# Altium footprint library Sockets.PcbLib: 80 footprints (part 3 of 6)
Each footprint in its own frame and in the unit in brackets; x right, y up, seen from the top. Pads: shape width x height; smd on the part's side, far side on the other; paste and mask are expansions set on the pad; w line width, h text height; cw(c..) or ccw(c..) is an arc to the next point about the centre after c.
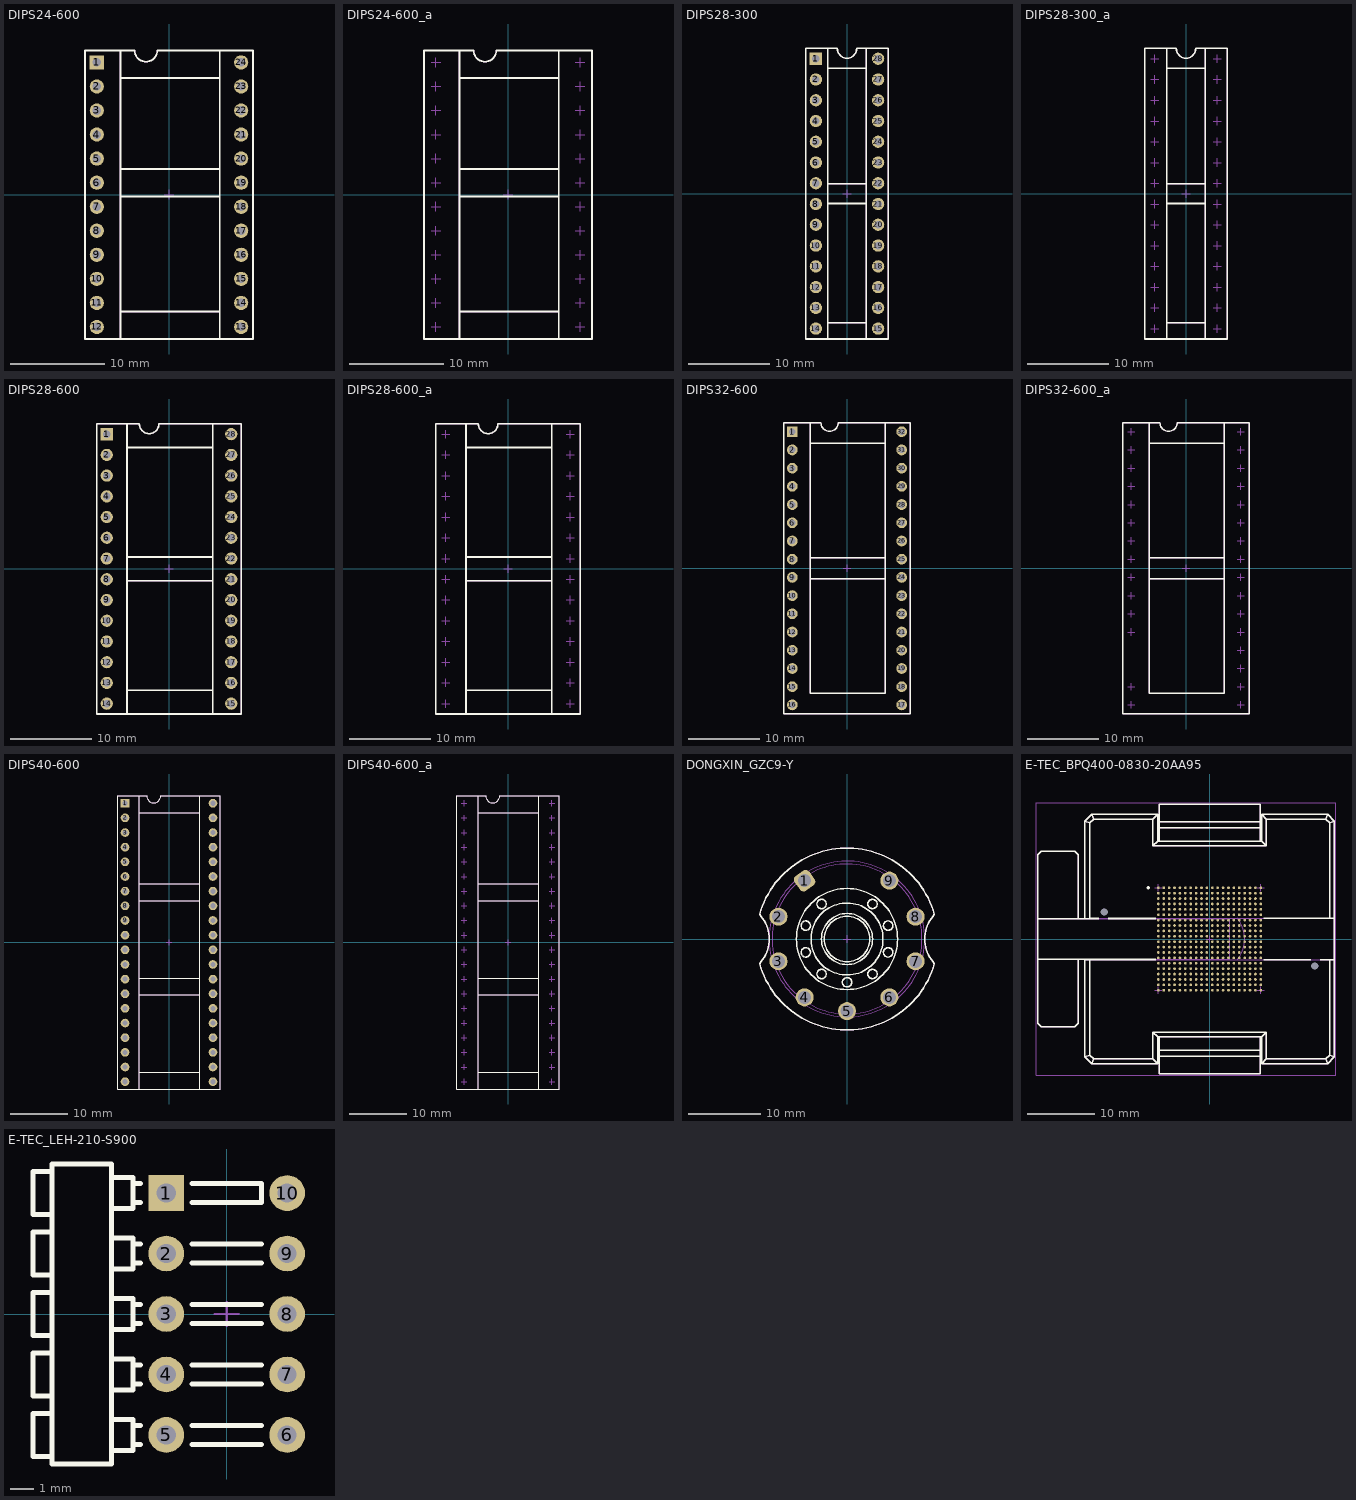
[diagram p2: the footprints below, top view; thin cyan lines are the x and y axes]

## DIPS24-600 [mm] "DIP Socket 24 Leads, Row Spacing 15.24mm; Pitch 2.54mm"
height 4.2
pads (24):
  rect 1.5x1.5 hole 0.9: 1(-7.62,13.97)
  round 1.5 hole 0.9: 2(-7.62,11.43) 3(-7.62,8.89) 4(-7.62,6.35) 5(-7.62,3.81) 6(-7.62,1.27) 7(-7.62,-1.27) 8(-7.62,-3.81) 9(-7.62,-6.35) 10(-7.62,-8.89) 11(-7.62,-11.43) 12(-7.62,-13.97) 13(7.62,-13.97) 14(7.62,-11.43) 15(7.62,-8.89) 16(7.62,-6.35) 17(7.62,-3.81) 18(7.62,-1.27) 19(7.62,1.27) 20(7.62,3.81) 21(7.62,6.35) 22(7.62,8.89) 23(7.62,11.43) 24(7.62,13.97)
Top Overlay:
  lines w0.2: -5.14,-15.24 -5.14,15.24 ; -5.14,-12.34 5.36,-12.34 ; -5.14,-0.18 5.36,-0.18 ; -5.14,2.72 5.36,2.72 ; -5.14,12.34 5.36,12.34 ; 5.36,-15.24 5.36,15.24 ; -8.85,-15.24 -8.85,15.24 -3.63,15.24 ccw(c-2.43,15.24) -1.23,15.24 8.85,15.24 8.85,-15.24 -8.85,-15.24
Mechanical 8:
  lines w0.1: -8.12,-13.97 -7.62,-13.97 ; -8.12,-11.43 -7.62,-11.43 ; -8.12,-8.89 -7.62,-8.89 ; -8.12,-6.35 -7.62,-6.35 ; -8.12,-3.81 -7.62,-3.81 ; -8.12,-1.27 -7.62,-1.27 ; -8.12,1.27 -7.62,1.27 ; -8.12,3.81 -7.62,3.81 ; -8.12,6.35 -7.62,6.35 ; -8.12,8.89 -7.62,8.89 ; -8.12,11.43 -7.62,11.43 ; -8.12,13.97 -7.62,13.97 ; -7.62,-14.47 -7.62,-13.97 ; -7.62,-13.47 -7.62,-13.97 ; -7.62,-11.93 -7.62,-11.43 ; -7.62,-10.93 -7.62,-11.43 ; -7.62,-9.39 -7.62,-8.89 ; -7.62,-8.39 -7.62,-8.89 ; -7.62,-6.85 -7.62,-6.35 ; -7.62,-5.85 -7.62,-6.35 ; -7.62,-4.31 -7.62,-3.81 ; -7.62,-3.31 -7.62,-3.81 ; -7.62,-1.77 -7.62,-1.27 ; -7.62,-0.77 -7.62,-1.27 ; -7.62,0.77 -7.62,1.27 ; -7.62,1.77 -7.62,1.27 ; -7.62,3.31 -7.62,3.81 ; -7.62,4.31 -7.62,3.81 ; -7.62,5.85 -7.62,6.35 ; -7.62,6.85 -7.62,6.35 ; -7.62,8.39 -7.62,8.89 ; -7.62,9.39 -7.62,8.89 ; -7.62,10.93 -7.62,11.43 ; -7.62,11.93 -7.62,11.43 ; -7.62,13.47 -7.62,13.97 ; -7.62,14.47 -7.62,13.97 ; -7.12,-13.97 -7.62,-13.97 ; -7.12,-11.43 -7.62,-11.43 ; -7.12,-8.89 -7.62,-8.89 ; -7.12,-6.35 -7.62,-6.35 ; -7.12,-3.81 -7.62,-3.81 ; -7.12,-1.27 -7.62,-1.27 ; -7.12,1.27 -7.62,1.27 ; -7.12,3.81 -7.62,3.81 ; -7.12,6.35 -7.62,6.35 ; -7.12,8.89 -7.62,8.89 ; -7.12,11.43 -7.62,11.43 ; -7.12,13.97 -7.62,13.97 ; -0.5,0 0,0 ; 0,-0.5 0,0 ; 0,0.5 0,0 ; 0.5,0 0,0 ; 7.12,-13.97 7.62,-13.97 ; 7.12,-11.43 7.62,-11.43 ; 7.12,-8.89 7.62,-8.89 ; 7.12,-6.35 7.62,-6.35 ; 7.12,-3.81 7.62,-3.81 ; 7.12,-1.27 7.62,-1.27 ; 7.12,1.27 7.62,1.27 ; 7.12,3.81 7.62,3.81 ; 7.12,6.35 7.62,6.35 ; 7.12,8.89 7.62,8.89 ; 7.12,11.43 7.62,11.43 ; 7.12,13.97 7.62,13.97 ; 7.62,-14.47 7.62,-13.97 ; 7.62,-13.47 7.62,-13.97 ; 7.62,-11.93 7.62,-11.43 ; 7.62,-10.93 7.62,-11.43 ; 7.62,-9.39 7.62,-8.89 ; 7.62,-8.39 7.62,-8.89 ; 7.62,-6.85 7.62,-6.35 ; 7.62,-5.85 7.62,-6.35 ; 7.62,-4.31 7.62,-3.81 ; 7.62,-3.31 7.62,-3.81 ; 7.62,-1.77 7.62,-1.27 ; 7.62,-0.77 7.62,-1.27 ; 7.62,0.77 7.62,1.27 ; 7.62,1.77 7.62,1.27 ; 7.62,3.31 7.62,3.81 ; 7.62,4.31 7.62,3.81 ; 7.62,5.85 7.62,6.35 ; 7.62,6.85 7.62,6.35 ; 7.62,8.39 7.62,8.89 ; 7.62,9.39 7.62,8.89 ; 7.62,10.93 7.62,11.43 ; 7.62,11.93 7.62,11.43 ; 7.62,13.47 7.62,13.97 ; 7.62,14.47 7.62,13.97 ; 8.12,-13.97 7.62,-13.97 ; 8.12,-11.43 7.62,-11.43 ; 8.12,-8.89 7.62,-8.89 ; 8.12,-6.35 7.62,-6.35 ; 8.12,-3.81 7.62,-3.81 ; 8.12,-1.27 7.62,-1.27 ; 8.12,1.27 7.62,1.27 ; 8.12,3.81 7.62,3.81 ; 8.12,6.35 7.62,6.35 ; 8.12,8.89 7.62,8.89 ; 8.12,11.43 7.62,11.43 ; 8.12,13.97 7.62,13.97
Mechanical 14:
  lines w0.1: -5.14,-15.24 -5.14,15.24 ; -5.14,-12.34 5.36,-12.34 ; -5.14,-0.18 5.36,-0.18 ; -5.14,2.72 5.36,2.72 ; -5.14,12.34 5.36,12.34 ; 5.36,-15.24 5.36,15.24 ; -8.85,-15.24 -8.85,15.24 -3.63,15.24 ccw(c-2.43,15.24) -1.23,15.24 8.85,15.24 8.85,-15.24 -8.85,-15.24
3D body "DIPS24-600.stp": height 4.2, standoff -3.17, extent -8.85,-15.24 8.85,15.24

## DIPS24-600_a [mm] "DIP Socket 24 Leads, Row Spacing 15.24mm; Pitch 2.54mm"
height 4.2
Top Overlay:
  lines w0.2: -5.14,-15.24 -5.14,15.24 ; -5.14,-12.34 5.36,-12.34 ; -5.14,-0.18 5.36,-0.18 ; -5.14,2.72 5.36,2.72 ; -5.14,12.34 5.36,12.34 ; 5.36,-15.24 5.36,15.24 ; -8.85,-15.24 8.85,-15.24 8.85,15.24 -1.23,15.24 cw(c-2.43,15.24) -3.63,15.24 -8.85,15.24 -8.85,-15.24
Mechanical 8:
  lines w0.1: -8.12,-13.97 -7.62,-13.97 ; -8.12,-11.43 -7.62,-11.43 ; -8.12,-8.89 -7.62,-8.89 ; -8.12,-6.35 -7.62,-6.35 ; -8.12,-3.81 -7.62,-3.81 ; -8.12,-1.27 -7.62,-1.27 ; -8.12,1.27 -7.62,1.27 ; -8.12,3.81 -7.62,3.81 ; -8.12,6.35 -7.62,6.35 ; -8.12,8.89 -7.62,8.89 ; -8.12,11.43 -7.62,11.43 ; -8.12,13.97 -7.62,13.97 ; -7.62,-14.47 -7.62,-13.97 ; -7.62,-13.47 -7.62,-13.97 ; -7.62,-11.93 -7.62,-11.43 ; -7.62,-10.93 -7.62,-11.43 ; -7.62,-9.39 -7.62,-8.89 ; -7.62,-8.39 -7.62,-8.89 ; -7.62,-6.85 -7.62,-6.35 ; -7.62,-5.85 -7.62,-6.35 ; -7.62,-4.31 -7.62,-3.81 ; -7.62,-3.31 -7.62,-3.81 ; -7.62,-1.77 -7.62,-1.27 ; -7.62,-0.77 -7.62,-1.27 ; -7.62,0.77 -7.62,1.27 ; -7.62,1.77 -7.62,1.27 ; -7.62,3.31 -7.62,3.81 ; -7.62,4.31 -7.62,3.81 ; -7.62,5.85 -7.62,6.35 ; -7.62,6.85 -7.62,6.35 ; -7.62,8.39 -7.62,8.89 ; -7.62,9.39 -7.62,8.89 ; -7.62,10.93 -7.62,11.43 ; -7.62,11.93 -7.62,11.43 ; -7.62,13.47 -7.62,13.97 ; -7.62,14.47 -7.62,13.97 ; -7.12,-13.97 -7.62,-13.97 ; -7.12,-11.43 -7.62,-11.43 ; -7.12,-8.89 -7.62,-8.89 ; -7.12,-6.35 -7.62,-6.35 ; -7.12,-3.81 -7.62,-3.81 ; -7.12,-1.27 -7.62,-1.27 ; -7.12,1.27 -7.62,1.27 ; -7.12,3.81 -7.62,3.81 ; -7.12,6.35 -7.62,6.35 ; -7.12,8.89 -7.62,8.89 ; -7.12,11.43 -7.62,11.43 ; -7.12,13.97 -7.62,13.97 ; -0.5,0 0,0 ; 0,-0.5 0,0 ; 0,0.5 0,0 ; 0.5,0 0,0 ; 7.12,-13.97 7.62,-13.97 ; 7.12,-11.43 7.62,-11.43 ; 7.12,-8.89 7.62,-8.89 ; 7.12,-6.35 7.62,-6.35 ; 7.12,-3.81 7.62,-3.81 ; 7.12,-1.27 7.62,-1.27 ; 7.12,1.27 7.62,1.27 ; 7.12,3.81 7.62,3.81 ; 7.12,6.35 7.62,6.35 ; 7.12,8.89 7.62,8.89 ; 7.12,11.43 7.62,11.43 ; 7.12,13.97 7.62,13.97 ; 7.62,-14.47 7.62,-13.97 ; 7.62,-13.47 7.62,-13.97 ; 7.62,-11.93 7.62,-11.43 ; 7.62,-10.93 7.62,-11.43 ; 7.62,-9.39 7.62,-8.89 ; 7.62,-8.39 7.62,-8.89 ; 7.62,-6.85 7.62,-6.35 ; 7.62,-5.85 7.62,-6.35 ; 7.62,-4.31 7.62,-3.81 ; 7.62,-3.31 7.62,-3.81 ; 7.62,-1.77 7.62,-1.27 ; 7.62,-0.77 7.62,-1.27 ; 7.62,0.77 7.62,1.27 ; 7.62,1.77 7.62,1.27 ; 7.62,3.31 7.62,3.81 ; 7.62,4.31 7.62,3.81 ; 7.62,5.85 7.62,6.35 ; 7.62,6.85 7.62,6.35 ; 7.62,8.39 7.62,8.89 ; 7.62,9.39 7.62,8.89 ; 7.62,10.93 7.62,11.43 ; 7.62,11.93 7.62,11.43 ; 7.62,13.47 7.62,13.97 ; 7.62,14.47 7.62,13.97 ; 8.12,-13.97 7.62,-13.97 ; 8.12,-11.43 7.62,-11.43 ; 8.12,-8.89 7.62,-8.89 ; 8.12,-6.35 7.62,-6.35 ; 8.12,-3.81 7.62,-3.81 ; 8.12,-1.27 7.62,-1.27 ; 8.12,1.27 7.62,1.27 ; 8.12,3.81 7.62,3.81 ; 8.12,6.35 7.62,6.35 ; 8.12,8.89 7.62,8.89 ; 8.12,11.43 7.62,11.43 ; 8.12,13.97 7.62,13.97
Mechanical 14:
  lines w0.1: -5.14,-15.24 -5.14,15.24 ; -5.14,-12.34 5.36,-12.34 ; -5.14,-0.18 5.36,-0.18 ; -5.14,2.72 5.36,2.72 ; -5.14,12.34 5.36,12.34 ; 5.36,-15.24 5.36,15.24 ; -8.85,-15.24 8.85,-15.24 8.85,15.24 -1.23,15.24 cw(c-2.43,15.24) -3.63,15.24 -8.85,15.24 -8.85,-15.24
3D body "DIPS24-600.stp": height 4.2, standoff -3.17, extent -8.85,-15.24 8.85,15.24

## DIPS28-300 [mm] "DIP Socket 28 Leads, Row Spacing 7.62mm; Pitch 2.54mm"
height 4.2
pads (28):
  rect 1.5x1.5 hole 0.9: 1(-3.81,16.51)
  round 1.5 hole 0.9: 2(-3.81,13.97) 3(-3.81,11.43) 4(-3.81,8.89) 5(-3.81,6.35) 6(-3.81,3.81) 7(-3.81,1.27) 8(-3.81,-1.27) 9(-3.81,-3.81) 10(-3.81,-6.35) 11(-3.81,-8.89) 12(-3.81,-11.43) 13(-3.81,-13.97) 14(-3.81,-16.51) 15(3.81,-16.51) 16(3.81,-13.97) 17(3.81,-11.43) 18(3.81,-8.89) 19(3.81,-6.35) 20(3.81,-3.81) 21(3.81,-1.27) 22(3.81,1.27) 23(3.81,3.81) 24(3.81,6.35) 25(3.81,8.89) 26(3.81,11.43) 27(3.81,13.97) 28(3.81,16.51)
Top Overlay:
  lines w0.2: -2.35,-17.78 -2.35,17.78 ; -2.35,-15.78 2.35,-15.78 ; -2.35,-1.2 2.35,-1.2 ; -2.35,1.2 2.35,1.2 ; -2.35,15.35 2.35,15.35 ; 2.35,-17.78 2.35,17.78 ; -5.05,-17.78 5.05,-17.78 5.05,17.78 1.175,17.78 cw(c0,17.75) -1.175,17.78 -5.05,17.78 -5.05,-17.78
Mechanical 8:
  lines w0.1: -4.31,-16.51 -3.81,-16.51 ; -4.31,-13.97 -3.81,-13.97 ; -4.31,-11.43 -3.81,-11.43 ; -4.31,-8.89 -3.81,-8.89 ; -4.31,-6.35 -3.81,-6.35 ; -4.31,-3.81 -3.81,-3.81 ; -4.31,-1.27 -3.81,-1.27 ; -4.31,1.27 -3.81,1.27 ; -4.31,3.81 -3.81,3.81 ; -4.31,6.35 -3.81,6.35 ; -4.31,8.89 -3.81,8.89 ; -4.31,11.43 -3.81,11.43 ; -4.31,13.97 -3.81,13.97 ; -4.31,16.51 -3.81,16.51 ; -3.81,-17.01 -3.81,-16.51 ; -3.81,-16.01 -3.81,-16.51 ; -3.81,-14.47 -3.81,-13.97 ; -3.81,-13.47 -3.81,-13.97 ; -3.81,-11.93 -3.81,-11.43 ; -3.81,-10.93 -3.81,-11.43 ; -3.81,-9.39 -3.81,-8.89 ; -3.81,-8.39 -3.81,-8.89 ; -3.81,-6.85 -3.81,-6.35 ; -3.81,-5.85 -3.81,-6.35 ; -3.81,-4.31 -3.81,-3.81 ; -3.81,-3.31 -3.81,-3.81 ; -3.81,-1.77 -3.81,-1.27 ; -3.81,-0.77 -3.81,-1.27 ; -3.81,0.77 -3.81,1.27 ; -3.81,1.77 -3.81,1.27 ; -3.81,3.31 -3.81,3.81 ; -3.81,4.31 -3.81,3.81 ; -3.81,5.85 -3.81,6.35 ; -3.81,6.85 -3.81,6.35 ; -3.81,8.39 -3.81,8.89 ; -3.81,9.39 -3.81,8.89 ; -3.81,10.93 -3.81,11.43 ; -3.81,11.93 -3.81,11.43 ; -3.81,13.47 -3.81,13.97 ; -3.81,14.47 -3.81,13.97 ; -3.81,16.01 -3.81,16.51 ; -3.81,17.01 -3.81,16.51 ; -3.31,-16.51 -3.81,-16.51 ; -3.31,-13.97 -3.81,-13.97 ; -3.31,-11.43 -3.81,-11.43 ; -3.31,-8.89 -3.81,-8.89 ; -3.31,-6.35 -3.81,-6.35 ; -3.31,-3.81 -3.81,-3.81 ; -3.31,-1.27 -3.81,-1.27 ; -3.31,1.27 -3.81,1.27 ; -3.31,3.81 -3.81,3.81 ; -3.31,6.35 -3.81,6.35 ; -3.31,8.89 -3.81,8.89 ; -3.31,11.43 -3.81,11.43 ; -3.31,13.97 -3.81,13.97 ; -3.31,16.51 -3.81,16.51 ; -0.5,0 0,0 ; 0,-0.5 0,0 ; 0,0.5 0,0 ; 0.5,0 0,0 ; 3.31,-16.51 3.81,-16.51 ; 3.31,-13.97 3.81,-13.97 ; 3.31,-11.43 3.81,-11.43 ; 3.31,-8.89 3.81,-8.89 ; 3.31,-6.35 3.81,-6.35 ; 3.31,-3.81 3.81,-3.81 ; 3.31,-1.27 3.81,-1.27 ; 3.31,1.27 3.81,1.27 ; 3.31,6.35 3.81,6.35 ; 3.31,8.89 3.81,8.89 ; 3.31,11.43 3.81,11.43 ; 3.31,13.97 3.81,13.97 ; 3.31,16.51 3.81,16.51 ; 3.81,-17.01 3.81,-16.51 ; 3.81,-16.01 3.81,-16.51 ; 3.81,-14.47 3.81,-13.97 ; 3.81,-13.47 3.81,-13.97 ; 3.81,-11.93 3.81,-11.43 ; 3.81,-10.93 3.81,-11.43 ; 3.81,-9.39 3.81,-8.89 ; 3.81,-8.39 3.81,-8.89 ; 3.81,-6.85 3.81,-6.35 ; 3.81,-5.85 3.81,-6.35 ; 3.81,-4.31 3.81,-3.81 ; 3.81,-3.31 3.81,-3.81 ; 3.81,-1.77 3.81,-1.27 ; 3.81,-0.77 3.81,-1.27 ; 3.81,0.77 3.81,1.27 ; 3.81,1.77 3.81,1.27 ; 3.81,5.85 3.81,6.35 ; 3.81,6.85 3.81,6.35 ; 3.81,8.39 3.81,8.89 ; 3.81,9.39 3.81,8.89 ; 3.81,10.93 3.81,11.43 ; 3.81,11.93 3.81,11.43 ; 3.81,13.47 3.81,13.97 ; 3.81,14.47 3.81,13.97 ; 3.81,16.01 3.81,16.51 ; 3.81,17.01 3.81,16.51 ; 4.31,-16.51 3.81,-16.51 ; 4.31,-13.97 3.81,-13.97 ; 4.31,-11.43 3.81,-11.43 ; 4.31,-8.89 3.81,-8.89 ; 4.31,-6.35 3.81,-6.35 ; 4.31,-3.81 3.81,-3.81 ; 4.31,-1.27 3.81,-1.27 ; 4.31,1.27 3.81,1.27 ; 4.31,6.35 3.81,6.35 ; 4.31,8.89 3.81,8.89 ; 4.31,11.43 3.81,11.43 ; 4.31,13.97 3.81,13.97 ; 4.31,16.51 3.81,16.51 ; 3.81,3.81 3.81,4.31 3.81,3.81 ; 3.81,3.81 3.81,3.31 3.81,3.81 ; 3.81,3.81 4.31,3.81 3.81,3.81 ; 3.81,3.81 3.31,3.81 3.81,3.81
Mechanical 14:
  lines w0.1: -2.35,-17.78 -2.35,17.78 ; -2.35,-15.78 2.35,-15.78 ; -2.35,-1.2 2.35,-1.2 ; -2.35,1.2 2.35,1.2 ; -2.35,15.35 2.35,15.35 ; 2.35,-17.78 2.35,17.78 ; -5.05,-17.78 5.05,-17.78 5.05,17.78 1.175,17.78 cw(c0,17.75) -1.175,17.78 -5.05,17.78 -5.05,-17.78
3D body "DIPS28-300.stp": height 4.2, standoff -3.17, extent -5.05,-17.78 5.05,17.78

## DIPS28-300_a [mm] "DIP Socket 28 Leads, Row Spacing 7.62mm; Pitch 2.54mm"
height 4.2
Top Overlay:
  lines w0.2: -2.35,-17.78 -2.35,17.78 ; -2.35,-15.78 2.35,-15.78 ; -2.35,-1.2 2.35,-1.2 ; -2.35,1.2 2.35,1.2 ; -2.35,15.35 2.35,15.35 ; 2.35,-17.78 2.35,17.78 ; -5.05,-17.78 -5.05,17.78 -1.175,17.78 ccw(c0,17.75) 1.175,17.78 5.05,17.78 5.05,-17.78 -5.05,-17.78
Mechanical 8:
  lines w0.1: -4.31,-16.51 -3.81,-16.51 ; -4.31,-13.97 -3.81,-13.97 ; -4.31,-11.43 -3.81,-11.43 ; -4.31,-8.89 -3.81,-8.89 ; -4.31,-6.35 -3.81,-6.35 ; -4.31,-3.81 -3.81,-3.81 ; -4.31,-1.27 -3.81,-1.27 ; -4.31,1.27 -3.81,1.27 ; -4.31,3.81 -3.81,3.81 ; -4.31,6.35 -3.81,6.35 ; -4.31,8.89 -3.81,8.89 ; -4.31,11.43 -3.81,11.43 ; -4.31,13.97 -3.81,13.97 ; -4.31,16.51 -3.81,16.51 ; -3.81,-17.01 -3.81,-16.51 ; -3.81,-16.01 -3.81,-16.51 ; -3.81,-14.47 -3.81,-13.97 ; -3.81,-13.47 -3.81,-13.97 ; -3.81,-11.93 -3.81,-11.43 ; -3.81,-10.93 -3.81,-11.43 ; -3.81,-9.39 -3.81,-8.89 ; -3.81,-8.39 -3.81,-8.89 ; -3.81,-6.85 -3.81,-6.35 ; -3.81,-5.85 -3.81,-6.35 ; -3.81,-4.31 -3.81,-3.81 ; -3.81,-3.31 -3.81,-3.81 ; -3.81,-1.77 -3.81,-1.27 ; -3.81,-0.77 -3.81,-1.27 ; -3.81,0.77 -3.81,1.27 ; -3.81,1.77 -3.81,1.27 ; -3.81,3.31 -3.81,3.81 ; -3.81,4.31 -3.81,3.81 ; -3.81,5.85 -3.81,6.35 ; -3.81,6.85 -3.81,6.35 ; -3.81,8.39 -3.81,8.89 ; -3.81,9.39 -3.81,8.89 ; -3.81,10.93 -3.81,11.43 ; -3.81,11.93 -3.81,11.43 ; -3.81,13.47 -3.81,13.97 ; -3.81,14.47 -3.81,13.97 ; -3.81,16.01 -3.81,16.51 ; -3.81,17.01 -3.81,16.51 ; -3.31,-16.51 -3.81,-16.51 ; -3.31,-13.97 -3.81,-13.97 ; -3.31,-11.43 -3.81,-11.43 ; -3.31,-8.89 -3.81,-8.89 ; -3.31,-6.35 -3.81,-6.35 ; -3.31,-3.81 -3.81,-3.81 ; -3.31,-1.27 -3.81,-1.27 ; -3.31,1.27 -3.81,1.27 ; -3.31,3.81 -3.81,3.81 ; -3.31,6.35 -3.81,6.35 ; -3.31,8.89 -3.81,8.89 ; -3.31,11.43 -3.81,11.43 ; -3.31,13.97 -3.81,13.97 ; -3.31,16.51 -3.81,16.51 ; -0.5,0 0,0 ; 0,-0.5 0,0 ; 0,0.5 0,0 ; 0.5,0 0,0 ; 3.31,-16.51 3.81,-16.51 ; 3.31,-13.97 3.81,-13.97 ; 3.31,-11.43 3.81,-11.43 ; 3.31,-8.89 3.81,-8.89 ; 3.31,-6.35 3.81,-6.35 ; 3.31,-3.81 3.81,-3.81 ; 3.31,-1.27 3.81,-1.27 ; 3.31,1.27 3.81,1.27 ; 3.31,6.35 3.81,6.35 ; 3.31,8.89 3.81,8.89 ; 3.31,11.43 3.81,11.43 ; 3.31,13.97 3.81,13.97 ; 3.31,16.51 3.81,16.51 ; 3.81,-17.01 3.81,-16.51 ; 3.81,-16.01 3.81,-16.51 ; 3.81,-14.47 3.81,-13.97 ; 3.81,-13.47 3.81,-13.97 ; 3.81,-11.93 3.81,-11.43 ; 3.81,-10.93 3.81,-11.43 ; 3.81,-9.39 3.81,-8.89 ; 3.81,-8.39 3.81,-8.89 ; 3.81,-6.85 3.81,-6.35 ; 3.81,-5.85 3.81,-6.35 ; 3.81,-4.31 3.81,-3.81 ; 3.81,-3.31 3.81,-3.81 ; 3.81,-1.77 3.81,-1.27 ; 3.81,-0.77 3.81,-1.27 ; 3.81,0.77 3.81,1.27 ; 3.81,1.77 3.81,1.27 ; 3.81,5.85 3.81,6.35 ; 3.81,6.85 3.81,6.35 ; 3.81,8.39 3.81,8.89 ; 3.81,9.39 3.81,8.89 ; 3.81,10.93 3.81,11.43 ; 3.81,11.93 3.81,11.43 ; 3.81,13.47 3.81,13.97 ; 3.81,14.47 3.81,13.97 ; 3.81,16.01 3.81,16.51 ; 3.81,17.01 3.81,16.51 ; 4.31,-16.51 3.81,-16.51 ; 4.31,-13.97 3.81,-13.97 ; 4.31,-11.43 3.81,-11.43 ; 4.31,-8.89 3.81,-8.89 ; 4.31,-6.35 3.81,-6.35 ; 4.31,-3.81 3.81,-3.81 ; 4.31,-1.27 3.81,-1.27 ; 4.31,1.27 3.81,1.27 ; 4.31,6.35 3.81,6.35 ; 4.31,8.89 3.81,8.89 ; 4.31,11.43 3.81,11.43 ; 4.31,13.97 3.81,13.97 ; 4.31,16.51 3.81,16.51 ; 3.81,3.81 3.31,3.81 3.81,3.81 ; 3.81,3.81 4.31,3.81 3.81,3.81 ; 3.81,3.81 3.81,3.31 3.81,3.81 ; 3.81,3.81 3.81,4.31 3.81,3.81
Mechanical 14:
  lines w0.1: -2.35,-17.78 -2.35,17.78 ; -2.35,-15.78 2.35,-15.78 ; -2.35,-1.2 2.35,-1.2 ; -2.35,1.2 2.35,1.2 ; -2.35,15.35 2.35,15.35 ; 2.35,-17.78 2.35,17.78 ; -5.05,-17.78 -5.05,17.78 -1.175,17.78 ccw(c0,17.75) 1.175,17.78 5.05,17.78 5.05,-17.78 -5.05,-17.78
3D body "DIPS28-300.stp": height 4.2, standoff -3.17, extent -5.05,-17.78 5.05,17.78

## DIPS28-600 [mm] "DIP Socket 28 Leads, Row Spacing 15.24mm; Pitch 2.54mm"
height 4.2
pads (28):
  rect 1.5x1.5 hole 0.9: 1(-7.62,16.51)
  round 1.5 hole 0.9: 2(-7.62,13.97) 3(-7.62,11.43) 4(-7.62,8.89) 5(-7.62,6.35) 6(-7.62,3.81) 7(-7.62,1.27) 8(-7.62,-1.27) 9(-7.62,-3.81) 10(-7.62,-6.35) 11(-7.62,-8.89) 12(-7.62,-11.43) 13(-7.62,-13.97) 14(-7.62,-16.51) 15(7.62,-16.51) 16(7.62,-13.97) 17(7.62,-11.43) 18(7.62,-8.89) 19(7.62,-6.35) 20(7.62,-3.81) 21(7.62,-1.27) 22(7.62,1.27) 23(7.62,3.81) 24(7.62,6.35) 25(7.62,8.89) 26(7.62,11.43) 27(7.62,13.97) 28(7.62,16.51)
Top Overlay:
  lines w0.2: -5.14,-17.78 -5.14,17.78 ; -5.14,-14.88 5.36,-14.88 ; -5.14,-1.45 5.36,-1.45 ; -5.14,1.45 5.36,1.45 ; -5.14,14.88 5.36,14.88 ; 5.36,-17.78 5.36,17.78 ; -8.85,-17.78 8.85,-17.78 8.85,17.78 -1.23,17.78 cw(c-2.43,17.78) -3.63,17.78 -8.85,17.78 -8.85,-17.78
Mechanical 8:
  lines w0.1: -8.12,-16.51 -7.62,-16.51 ; -8.12,-13.97 -7.62,-13.97 ; -8.12,-11.43 -7.62,-11.43 ; -8.12,-8.89 -7.62,-8.89 ; -8.12,-6.35 -7.62,-6.35 ; -8.12,-3.81 -7.62,-3.81 ; -8.12,-1.27 -7.62,-1.27 ; -8.12,1.27 -7.62,1.27 ; -8.12,3.81 -7.62,3.81 ; -8.12,6.35 -7.62,6.35 ; -8.12,8.89 -7.62,8.89 ; -8.12,11.43 -7.62,11.43 ; -8.12,13.97 -7.62,13.97 ; -8.12,16.51 -7.62,16.51 ; -7.62,-17.01 -7.62,-16.51 ; -7.62,-16.01 -7.62,-16.51 ; -7.62,-14.47 -7.62,-13.97 ; -7.62,-13.47 -7.62,-13.97 ; -7.62,-11.93 -7.62,-11.43 ; -7.62,-10.93 -7.62,-11.43 ; -7.62,-9.39 -7.62,-8.89 ; -7.62,-8.39 -7.62,-8.89 ; -7.62,-6.85 -7.62,-6.35 ; -7.62,-5.85 -7.62,-6.35 ; -7.62,-4.31 -7.62,-3.81 ; -7.62,-3.31 -7.62,-3.81 ; -7.62,-1.77 -7.62,-1.27 ; -7.62,-0.77 -7.62,-1.27 ; -7.62,0.77 -7.62,1.27 ; -7.62,1.77 -7.62,1.27 ; -7.62,3.31 -7.62,3.81 ; -7.62,4.31 -7.62,3.81 ; -7.62,5.85 -7.62,6.35 ; -7.62,6.85 -7.62,6.35 ; -7.62,8.39 -7.62,8.89 ; -7.62,9.39 -7.62,8.89 ; -7.62,10.93 -7.62,11.43 ; -7.62,11.93 -7.62,11.43 ; -7.62,13.47 -7.62,13.97 ; -7.62,14.47 -7.62,13.97 ; -7.62,16.01 -7.62,16.51 ; -7.62,17.01 -7.62,16.51 ; -7.12,-16.51 -7.62,-16.51 ; -7.12,-13.97 -7.62,-13.97 ; -7.12,-11.43 -7.62,-11.43 ; -7.12,-8.89 -7.62,-8.89 ; -7.12,-6.35 -7.62,-6.35 ; -7.12,-3.81 -7.62,-3.81 ; -7.12,-1.27 -7.62,-1.27 ; -7.12,1.27 -7.62,1.27 ; -7.12,3.81 -7.62,3.81 ; -7.12,6.35 -7.62,6.35 ; -7.12,8.89 -7.62,8.89 ; -7.12,11.43 -7.62,11.43 ; -7.12,13.97 -7.62,13.97 ; -7.12,16.51 -7.62,16.51 ; -0.5,0 0,0 ; 0,-0.5 0,0 ; 0,0.5 0,0 ; 0.5,0 0,0 ; 7.12,-16.51 7.62,-16.51 ; 7.12,-13.97 7.62,-13.97 ; 7.12,-11.43 7.62,-11.43 ; 7.12,-8.89 7.62,-8.89 ; 7.12,-6.35 7.62,-6.35 ; 7.12,-3.81 7.62,-3.81 ; 7.12,-1.27 7.62,-1.27 ; 7.12,1.27 7.62,1.27 ; 7.12,3.81 7.62,3.81 ; 7.12,6.35 7.62,6.35 ; 7.12,8.89 7.62,8.89 ; 7.12,11.43 7.62,11.43 ; 7.12,13.97 7.62,13.97 ; 7.12,16.51 7.62,16.51 ; 7.62,-17.01 7.62,-16.51 ; 7.62,-16.01 7.62,-16.51 ; 7.62,-14.47 7.62,-13.97 ; 7.62,-13.47 7.62,-13.97 ; 7.62,-11.93 7.62,-11.43 ; 7.62,-10.93 7.62,-11.43 ; 7.62,-9.39 7.62,-8.89 ; 7.62,-8.39 7.62,-8.89 ; 7.62,-6.85 7.62,-6.35 ; 7.62,-5.85 7.62,-6.35 ; 7.62,-4.31 7.62,-3.81 ; 7.62,-3.31 7.62,-3.81 ; 7.62,-1.77 7.62,-1.27 ; 7.62,-0.77 7.62,-1.27 ; 7.62,0.77 7.62,1.27 ; 7.62,1.77 7.62,1.27 ; 7.62,3.31 7.62,3.81 ; 7.62,4.31 7.62,3.81 ; 7.62,5.85 7.62,6.35 ; 7.62,6.85 7.62,6.35 ; 7.62,8.39 7.62,8.89 ; 7.62,9.39 7.62,8.89 ; 7.62,10.93 7.62,11.43 ; 7.62,11.93 7.62,11.43 ; 7.62,13.47 7.62,13.97 ; 7.62,14.47 7.62,13.97 ; 7.62,16.01 7.62,16.51 ; 7.62,17.01 7.62,16.51 ; 8.12,-16.51 7.62,-16.51 ; 8.12,-13.97 7.62,-13.97 ; 8.12,-11.43 7.62,-11.43 ; 8.12,-8.89 7.62,-8.89 ; 8.12,-6.35 7.62,-6.35 ; 8.12,-3.81 7.62,-3.81 ; 8.12,-1.27 7.62,-1.27 ; 8.12,1.27 7.62,1.27 ; 8.12,3.81 7.62,3.81 ; 8.12,6.35 7.62,6.35 ; 8.12,8.89 7.62,8.89 ; 8.12,11.43 7.62,11.43 ; 8.12,13.97 7.62,13.97 ; 8.12,16.51 7.62,16.51
Mechanical 14:
  lines w0.1: -5.14,-17.78 -5.14,17.78 ; -5.14,-14.88 5.36,-14.88 ; -5.14,-1.45 5.36,-1.45 ; -5.14,1.45 5.36,1.45 ; -5.14,14.88 5.36,14.88 ; 5.36,-17.78 5.36,17.78 ; -8.85,-17.78 8.85,-17.78 8.85,17.78 -1.23,17.78 cw(c-2.43,17.78) -3.63,17.78 -8.85,17.78 -8.85,-17.78
3D body "DIPS28-600.stp": height 4.2, standoff -3.17, extent -8.85,-17.78 8.85,17.78

## DIPS28-600_a [mm] "DIP Socket 28 Leads, Row Spacing 15.24mm; Pitch 2.54mm"
height 4.2
Top Overlay:
  lines w0.2: -5.14,-17.78 -5.14,17.78 ; -5.14,-14.88 5.36,-14.88 ; -5.14,-1.45 5.36,-1.45 ; -5.14,1.45 5.36,1.45 ; -5.14,14.88 5.36,14.88 ; 5.36,-17.78 5.36,17.78 ; -8.85,-17.78 8.85,-17.78 8.85,17.78 -1.23,17.78 cw(c-2.43,17.78) -3.63,17.78 -8.85,17.78 -8.85,-17.78
Mechanical 8:
  lines w0.1: -8.12,-16.51 -7.62,-16.51 ; -8.12,-13.97 -7.62,-13.97 ; -8.12,-11.43 -7.62,-11.43 ; -8.12,-8.89 -7.62,-8.89 ; -8.12,-6.35 -7.62,-6.35 ; -8.12,-3.81 -7.62,-3.81 ; -8.12,-1.27 -7.62,-1.27 ; -8.12,1.27 -7.62,1.27 ; -8.12,3.81 -7.62,3.81 ; -8.12,6.35 -7.62,6.35 ; -8.12,8.89 -7.62,8.89 ; -8.12,11.43 -7.62,11.43 ; -8.12,13.97 -7.62,13.97 ; -8.12,16.51 -7.62,16.51 ; -7.62,-17.01 -7.62,-16.51 ; -7.62,-16.01 -7.62,-16.51 ; -7.62,-14.47 -7.62,-13.97 ; -7.62,-13.47 -7.62,-13.97 ; -7.62,-11.93 -7.62,-11.43 ; -7.62,-10.93 -7.62,-11.43 ; -7.62,-9.39 -7.62,-8.89 ; -7.62,-8.39 -7.62,-8.89 ; -7.62,-6.85 -7.62,-6.35 ; -7.62,-5.85 -7.62,-6.35 ; -7.62,-4.31 -7.62,-3.81 ; -7.62,-3.31 -7.62,-3.81 ; -7.62,-1.77 -7.62,-1.27 ; -7.62,-0.77 -7.62,-1.27 ; -7.62,0.77 -7.62,1.27 ; -7.62,1.77 -7.62,1.27 ; -7.62,3.31 -7.62,3.81 ; -7.62,4.31 -7.62,3.81 ; -7.62,5.85 -7.62,6.35 ; -7.62,6.85 -7.62,6.35 ; -7.62,8.39 -7.62,8.89 ; -7.62,9.39 -7.62,8.89 ; -7.62,10.93 -7.62,11.43 ; -7.62,11.93 -7.62,11.43 ; -7.62,13.47 -7.62,13.97 ; -7.62,14.47 -7.62,13.97 ; -7.62,16.01 -7.62,16.51 ; -7.62,17.01 -7.62,16.51 ; -7.12,-16.51 -7.62,-16.51 ; -7.12,-13.97 -7.62,-13.97 ; -7.12,-11.43 -7.62,-11.43 ; -7.12,-8.89 -7.62,-8.89 ; -7.12,-6.35 -7.62,-6.35 ; -7.12,-3.81 -7.62,-3.81 ; -7.12,-1.27 -7.62,-1.27 ; -7.12,1.27 -7.62,1.27 ; -7.12,3.81 -7.62,3.81 ; -7.12,6.35 -7.62,6.35 ; -7.12,8.89 -7.62,8.89 ; -7.12,11.43 -7.62,11.43 ; -7.12,13.97 -7.62,13.97 ; -7.12,16.51 -7.62,16.51 ; -0.5,0 0,0 ; 0,-0.5 0,0 ; 0,0.5 0,0 ; 0.5,0 0,0 ; 7.12,-16.51 7.62,-16.51 ; 7.12,-13.97 7.62,-13.97 ; 7.12,-11.43 7.62,-11.43 ; 7.12,-8.89 7.62,-8.89 ; 7.12,-6.35 7.62,-6.35 ; 7.12,-3.81 7.62,-3.81 ; 7.12,-1.27 7.62,-1.27 ; 7.12,1.27 7.62,1.27 ; 7.12,3.81 7.62,3.81 ; 7.12,6.35 7.62,6.35 ; 7.12,8.89 7.62,8.89 ; 7.12,11.43 7.62,11.43 ; 7.12,13.97 7.62,13.97 ; 7.12,16.51 7.62,16.51 ; 7.62,-17.01 7.62,-16.51 ; 7.62,-16.01 7.62,-16.51 ; 7.62,-14.47 7.62,-13.97 ; 7.62,-13.47 7.62,-13.97 ; 7.62,-11.93 7.62,-11.43 ; 7.62,-10.93 7.62,-11.43 ; 7.62,-9.39 7.62,-8.89 ; 7.62,-8.39 7.62,-8.89 ; 7.62,-6.85 7.62,-6.35 ; 7.62,-5.85 7.62,-6.35 ; 7.62,-4.31 7.62,-3.81 ; 7.62,-3.31 7.62,-3.81 ; 7.62,-1.77 7.62,-1.27 ; 7.62,-0.77 7.62,-1.27 ; 7.62,0.77 7.62,1.27 ; 7.62,1.77 7.62,1.27 ; 7.62,3.31 7.62,3.81 ; 7.62,4.31 7.62,3.81 ; 7.62,5.85 7.62,6.35 ; 7.62,6.85 7.62,6.35 ; 7.62,8.39 7.62,8.89 ; 7.62,9.39 7.62,8.89 ; 7.62,10.93 7.62,11.43 ; 7.62,11.93 7.62,11.43 ; 7.62,13.47 7.62,13.97 ; 7.62,14.47 7.62,13.97 ; 7.62,16.01 7.62,16.51 ; 7.62,17.01 7.62,16.51 ; 8.12,-16.51 7.62,-16.51 ; 8.12,-13.97 7.62,-13.97 ; 8.12,-11.43 7.62,-11.43 ; 8.12,-8.89 7.62,-8.89 ; 8.12,-6.35 7.62,-6.35 ; 8.12,-3.81 7.62,-3.81 ; 8.12,-1.27 7.62,-1.27 ; 8.12,1.27 7.62,1.27 ; 8.12,3.81 7.62,3.81 ; 8.12,6.35 7.62,6.35 ; 8.12,8.89 7.62,8.89 ; 8.12,11.43 7.62,11.43 ; 8.12,13.97 7.62,13.97 ; 8.12,16.51 7.62,16.51
Mechanical 14:
  lines w0.1: -5.14,-17.78 -5.14,17.78 ; -5.14,-14.88 5.36,-14.88 ; -5.14,-1.45 5.36,-1.45 ; -5.14,1.45 5.36,1.45 ; -5.14,14.88 5.36,14.88 ; 5.36,-17.78 5.36,17.78 ; -8.85,-17.78 8.85,-17.78 8.85,17.78 -1.23,17.78 cw(c-2.43,17.78) -3.63,17.78 -8.85,17.78 -8.85,-17.78